# Altium footprint library NtentePoC.PcbLib: 32 footprints (part 2 of 2)
Each footprint in its own frame and in the unit in brackets; x right, y up, seen from the top. Pads: shape width x height; smd on the part's side, far side on the other; paste and mask are expansions set on the pad; w line width, h text height; cw(c..) or ccw(c..) is an arc to the next point about the centre after c.
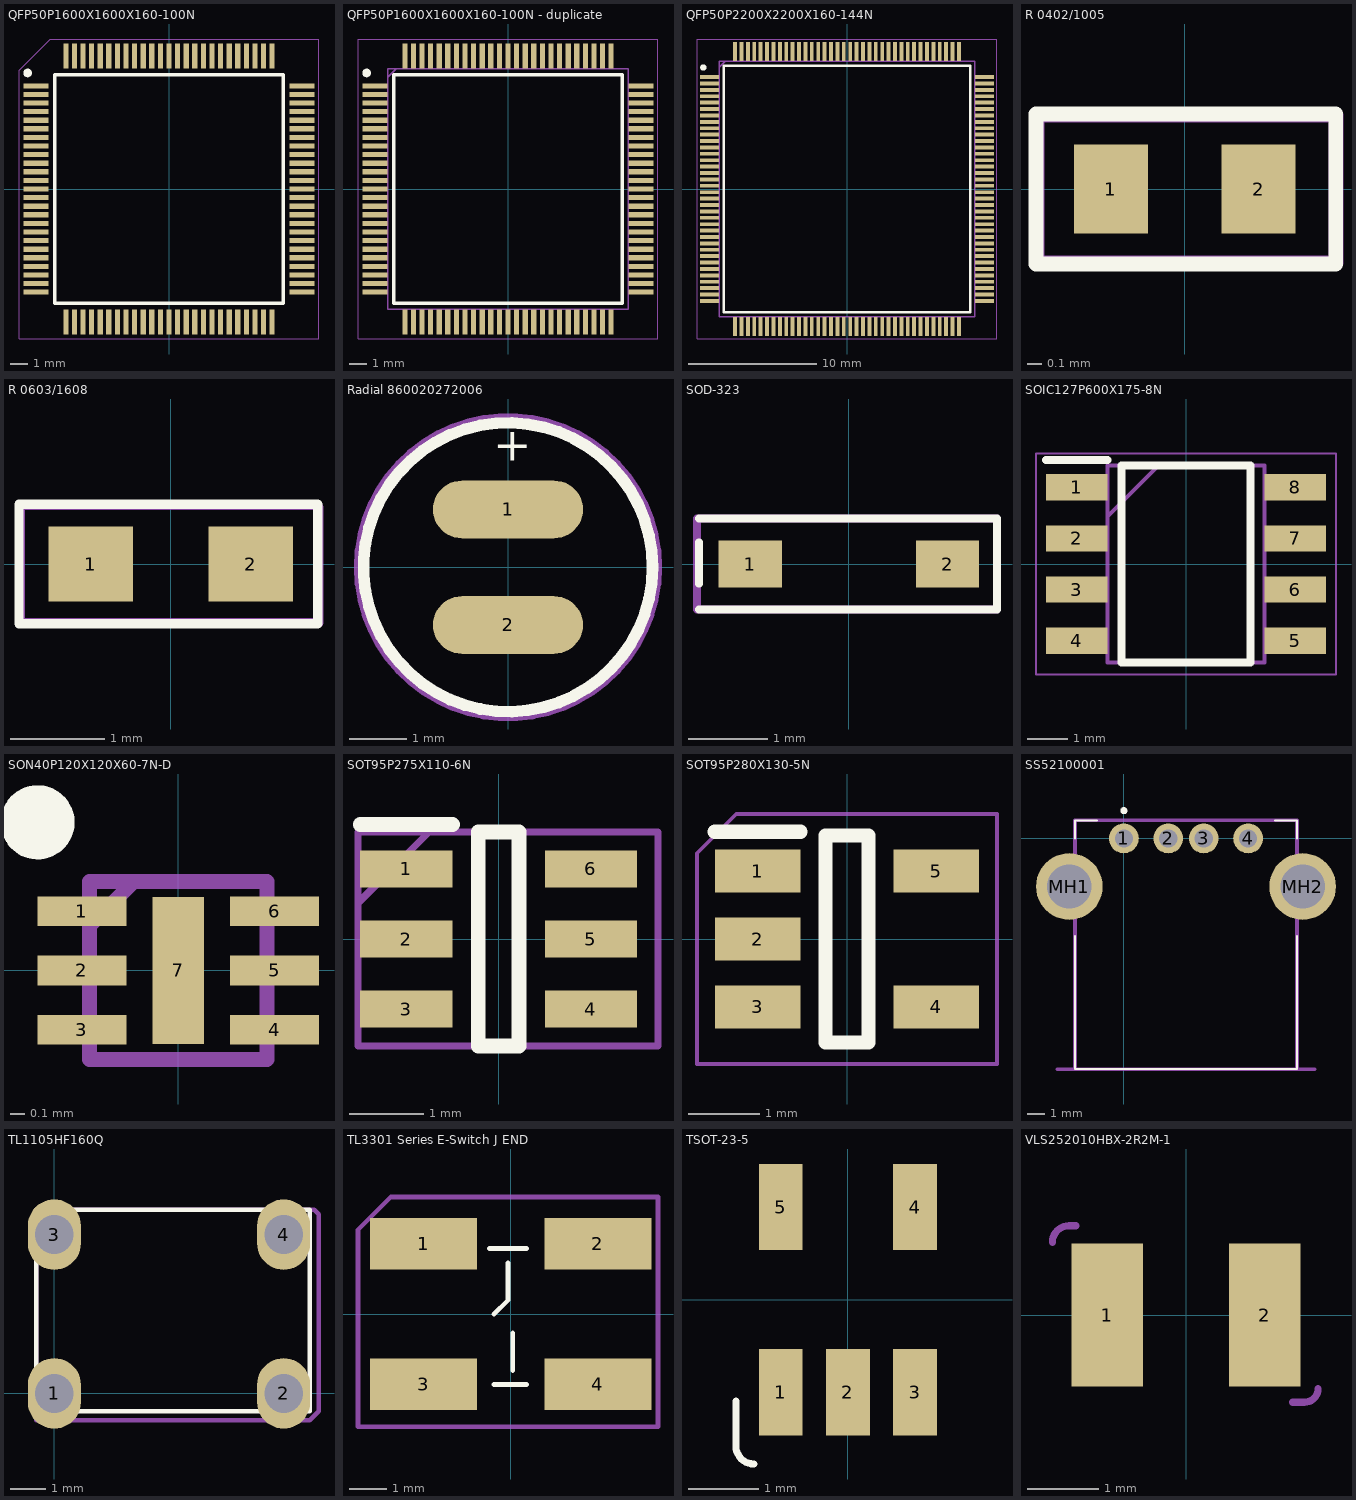
[diagram p1: the footprints below, top view; thin cyan lines are the x and y axes]

## QFP50P1600X1600X160-100N [mm]
pads (100):
  rect 1.475x0.3 smd: 1(-7.738,6) 2(-7.738,5.5) 3(-7.738,5) 4(-7.738,4.5) 5(-7.738,4) 6(-7.738,3.5) 7(-7.738,3) 8(-7.738,2.5) 9(-7.738,2) 10(-7.738,1.5) 11(-7.738,1) 12(-7.738,0.5) 13(-7.738,0) 14(-7.738,-0.5) 15(-7.738,-1) 16(-7.738,-1.5) 17(-7.738,-2) 18(-7.738,-2.5) 19(-7.738,-3) 20(-7.738,-3.5) 21(-7.738,-4) 22(-7.738,-4.5) 23(-7.738,-5) 24(-7.738,-5.5) 25(-7.738,-6) 51(7.738,-6) 52(7.738,-5.5) 53(7.738,-5) 54(7.738,-4.5) 55(7.738,-4) 56(7.738,-3.5) 57(7.738,-3) 58(7.738,-2.5) 59(7.738,-2) 60(7.738,-1.5) 61(7.738,-1) 62(7.738,-0.5) 63(7.738,0) 64(7.738,0.5) 65(7.738,1) 66(7.738,1.5) 67(7.738,2) 68(7.738,2.5) 69(7.738,3) 70(7.738,3.5) 71(7.738,4) 72(7.738,4.5) 73(7.738,5) 74(7.738,5.5) 75(7.738,6)
  rect 0.3x1.475 smd: 26(-6,-7.738) 27(-5.5,-7.738) 28(-5,-7.738) 29(-4.5,-7.738) 30(-4,-7.738) 31(-3.5,-7.738) 32(-3,-7.738) 33(-2.5,-7.738) 34(-2,-7.738) 35(-1.5,-7.738) 36(-1,-7.738) 37(-0.5,-7.738) 38(0,-7.738) 39(0.5,-7.738) 40(1,-7.738) 41(1.5,-7.738) 42(2,-7.738) 43(2.5,-7.738) 44(3,-7.738) 45(3.5,-7.738) 46(4,-7.738) 47(4.5,-7.738) 48(5,-7.738) 49(5.5,-7.738) 50(6,-7.738) 76(6,7.738) 77(5.5,7.738) 78(5,7.738) 79(4.5,7.738) 80(4,7.738) 81(3.5,7.738) 82(3,7.738) 83(2.5,7.738) 84(2,7.738) 85(1.5,7.738) 86(1,7.738) 87(0.5,7.738) 88(0,7.738) 89(-0.5,7.738) 90(-1,7.738) 91(-1.5,7.738) 92(-2,7.738) 93(-2.5,7.738) 94(-3,7.738) 95(-3.5,7.738) 96(-4,7.738) 97(-4.5,7.738) 98(-5,7.738) 99(-5.5,7.738) 100(-6,7.738)
Top Overlay:
  circle w0.25: c-8.225,6.75 r0.125
  lines w0.2: -6.65,-6.65 6.65,-6.65 6.65,6.65 -6.65,6.65 -6.65,-6.65
Mechanical 29 (Mech29):
  lines w0.05: -8.725,-8.725 -8.725,6.896 -6.896,8.725 8.725,8.725 8.725,-8.725 -8.725,-8.725
  text ".Designator" at -2.413,-0.381 h1
3D body "STM32F407VET6.stp": height 1.6, standoff 0, extent -8,-8 8,8

## QFP50P1600X1600X160-100N - duplicate [mm]
pads (100):
  rect 1.475x0.3 smd: 1(-7.738,6) 2(-7.738,5.5) 3(-7.738,5) 4(-7.738,4.5) 5(-7.738,4) 6(-7.738,3.5) 7(-7.738,3) 8(-7.738,2.5) 9(-7.738,2) 10(-7.738,1.5) 11(-7.738,1) 12(-7.738,0.5) 13(-7.738,0) 14(-7.738,-0.5) 15(-7.738,-1) 16(-7.738,-1.5) 17(-7.738,-2) 18(-7.738,-2.5) 19(-7.738,-3) 20(-7.738,-3.5) 21(-7.738,-4) 22(-7.738,-4.5) 23(-7.738,-5) 24(-7.738,-5.5) 25(-7.738,-6) 51(7.738,-6) 52(7.738,-5.5) 53(7.738,-5) 54(7.738,-4.5) 55(7.738,-4) 56(7.738,-3.5) 57(7.738,-3) 58(7.738,-2.5) 59(7.738,-2) 60(7.738,-1.5) 61(7.738,-1) 62(7.738,-0.5) 63(7.738,0) 64(7.738,0.5) 65(7.738,1) 66(7.738,1.5) 67(7.738,2) 68(7.738,2.5) 69(7.738,3) 70(7.738,3.5) 71(7.738,4) 72(7.738,4.5) 73(7.738,5) 74(7.738,5.5) 75(7.738,6)
  rect 0.3x1.475 smd: 26(-6,-7.738) 27(-5.5,-7.738) 28(-5,-7.738) 29(-4.5,-7.738) 30(-4,-7.738) 31(-3.5,-7.738) 32(-3,-7.738) 33(-2.5,-7.738) 34(-2,-7.738) 35(-1.5,-7.738) 36(-1,-7.738) 37(-0.5,-7.738) 38(0,-7.738) 39(0.5,-7.738) 40(1,-7.738) 41(1.5,-7.738) 42(2,-7.738) 43(2.5,-7.738) 44(3,-7.738) 45(3.5,-7.738) 46(4,-7.738) 47(4.5,-7.738) 48(5,-7.738) 49(5.5,-7.738) 50(6,-7.738) 76(6,7.738) 77(5.5,7.738) 78(5,7.738) 79(4.5,7.738) 80(4,7.738) 81(3.5,7.738) 82(3,7.738) 83(2.5,7.738) 84(2,7.738) 85(1.5,7.738) 86(1,7.738) 87(0.5,7.738) 88(0,7.738) 89(-0.5,7.738) 90(-1,7.738) 91(-1.5,7.738) 92(-2,7.738) 93(-2.5,7.738) 94(-3,7.738) 95(-3.5,7.738) 96(-4,7.738) 97(-4.5,7.738) 98(-5,7.738) 99(-5.5,7.738) 100(-6,7.738)
Top Overlay:
  circle w0.25: c-8.225,6.75 r0.125
  lines w0.2: -6.65,-6.65 -6.65,6.65 6.65,6.65 6.65,-6.65 -6.65,-6.65
Mechanical 13:
  lines w0.1: -7,6.5 -6.5,7 ; -7,-7 -7,7 7,7 7,-7 -7,-7
Mechanical 15:
  lines w0.05: -8.725,-8.725 -8.725,8.725 8.725,8.725 8.725,-8.725 -8.725,-8.725
3D body "STM32F107VCT6.stp": height 1.6, standoff 0, extent -8,-8 8,8

## QFP50P2200X2200X160-144N [mm]
pads (144):
  rect 1.475x0.3 smd: 1(-10.738,8.75) 2(-10.738,8.25) 3(-10.738,7.75) 4(-10.738,7.25) 5(-10.738,6.75) 6(-10.738,6.25) 7(-10.738,5.75) 8(-10.738,5.25) 9(-10.738,4.75) 10(-10.738,4.25) 11(-10.738,3.75) 12(-10.738,3.25) 13(-10.738,2.75) 14(-10.738,2.25) 15(-10.738,1.75) 16(-10.738,1.25) 17(-10.738,0.75) 18(-10.738,0.25) 19(-10.738,-0.25) 20(-10.738,-0.75) 21(-10.738,-1.25) 22(-10.738,-1.75) 23(-10.738,-2.25) 24(-10.738,-2.75) 25(-10.738,-3.25) 26(-10.738,-3.75) 27(-10.738,-4.25) 28(-10.738,-4.75) 29(-10.738,-5.25) 30(-10.738,-5.75) 31(-10.738,-6.25) 32(-10.738,-6.75) 33(-10.738,-7.25) 34(-10.738,-7.75) 35(-10.738,-8.25) 36(-10.738,-8.75) 73(10.738,-8.75) 74(10.738,-8.25) 75(10.738,-7.75) 76(10.738,-7.25) 77(10.738,-6.75) 78(10.738,-6.25) 79(10.738,-5.75) 80(10.738,-5.25) 81(10.738,-4.75) 82(10.738,-4.25) 83(10.738,-3.75) 84(10.738,-3.25) 85(10.738,-2.75) 86(10.738,-2.25) 87(10.738,-1.75) 88(10.738,-1.25) 89(10.738,-0.75) 90(10.738,-0.25) 91(10.738,0.25) 92(10.738,0.75) 93(10.738,1.25) 94(10.738,1.75) 95(10.738,2.25) 96(10.738,2.75) 97(10.738,3.25) 98(10.738,3.75) 99(10.738,4.25) 100(10.738,4.75) 101(10.738,5.25) 102(10.738,5.75) 103(10.738,6.25) 104(10.738,6.75) 105(10.738,7.25) 106(10.738,7.75) 107(10.738,8.25) 108(10.738,8.75)
  rect 0.3x1.475 smd: 37(-8.75,-10.738) 38(-8.25,-10.738) 39(-7.75,-10.738) 40(-7.25,-10.738) 41(-6.75,-10.738) 42(-6.25,-10.738) 43(-5.75,-10.738) 44(-5.25,-10.738) 45(-4.75,-10.738) 46(-4.25,-10.738) 47(-3.75,-10.738) 48(-3.25,-10.738) 49(-2.75,-10.738) 50(-2.25,-10.738) 51(-1.75,-10.738) 52(-1.25,-10.738) 53(-0.75,-10.738) 54(-0.25,-10.738) 55(0.25,-10.738) 56(0.75,-10.738) 57(1.25,-10.738) 58(1.75,-10.738) 59(2.25,-10.738) 60(2.75,-10.738) 61(3.25,-10.738) 62(3.75,-10.738) 63(4.25,-10.738) 64(4.75,-10.738) 65(5.25,-10.738) 66(5.75,-10.738) 67(6.25,-10.738) 68(6.75,-10.738) 69(7.25,-10.738) 70(7.75,-10.738) 71(8.25,-10.738) 72(8.75,-10.738) 109(8.75,10.738) 110(8.25,10.738) 111(7.75,10.738) 112(7.25,10.738) 113(6.75,10.738) 114(6.25,10.738) 115(5.75,10.738) 116(5.25,10.738) 117(4.75,10.738) 118(4.25,10.738) 119(3.75,10.738) 120(3.25,10.738) 121(2.75,10.738) 122(2.25,10.738) 123(1.75,10.738) 124(1.25,10.738) 125(0.75,10.738) 126(0.25,10.738) 127(-0.25,10.738) 128(-0.75,10.738) 129(-1.25,10.738) 130(-1.75,10.738) 131(-2.25,10.738) 132(-2.75,10.738) 133(-3.25,10.738) 134(-3.75,10.738) 135(-4.25,10.738) 136(-4.75,10.738) 137(-5.25,10.738) 138(-5.75,10.738) 139(-6.25,10.738) 140(-6.75,10.738) 141(-7.25,10.738) 142(-7.75,10.738) 143(-8.25,10.738) 144(-8.75,10.738)
Top Overlay:
  circle w0.25: c-11.225,9.5 r0.125
  lines w0.2: -9.65,-9.65 9.65,-9.65 9.65,9.65 -9.65,9.65 -9.65,-9.65
Mechanical 13:
  lines w0.1: -10,9.5 -9.5,10 ; -10,-10 10,-10 10,10 -10,10 -10,-10
  text ".Designator" at -2.032,-1.27 h1
Mechanical 15:
  lines w0.05: -11.725,-11.725 11.725,-11.725 11.725,11.725 -11.725,11.725 -11.725,-11.725
3D body "STM32F407ZET6.stp": height 1.6, standoff 0, extent -11,-11 11,11

## R 0402/1005 [mm]
pads (2):
  rect 0.5x0.6 smd: 1(-0.5,0) 2(0.5,0)
Top Overlay:
  lines w0.1: -1.008,-0.508 -1.008,0.508 1.024,0.508 1.024,-0.508 -1.008,-0.508
Mechanical 29 (Mech29):
  lines w0.1: -1,-0.5 1.025,-0.5 1.025,0.5 -1,0.5 -1,-0.5
  text ".Designator" at -0.85,-0.3 h0.6
3D body: height 0.64, standoff 0, extent 0.525,-0.3 0.75,0.3
3D body: height 0.64, standoff 0, extent -0.75,-0.3 -0.5,0.3
3D body: height 0.64, standoff 0, extent -0.5,-0.3 0.525,0.3

## R 0603/1608 [mm]
pads (2):
  rect 0.9x0.8 smd: 1(-0.85,0) 2(0.85,0)
Top Overlay:
  lines w0.1: -1.612,-0.635 -1.612,0.635 1.563,0.635 1.563,-0.635 -1.612,-0.635
Mechanical 29 (Mech29):
  lines w0.1: -1.6,-0.625 -1.6,0.625 1.55,0.625 1.575,0.6 1.575,-0.625 -1.6,-0.625
  text ".Designator" at -1.425,-0.4 h0.8
3D body: height 0.64, standoff 0, extent -0.85,-0.4 0.85,0.4
3D body: height 0.64, standoff 0, extent -1.3,-0.4 -0.85,0.4
3D body: height 0.64, standoff 0, extent 0.85,-0.4 1.3,0.4

## Radial 860020272006 [mm]
pads (2):
  oval 2.6x1 smd: 1(0,1) 2(0,-1)
Top Overlay:
  circle w0.2: c0,0 r2.5
  text "+" at -0.254,1.651 h1
Mechanical 29 (Mech29):
  circle w0.254: c0,0 r2.54
  text ".Designator" at -1.079,-0.254 h1
3D body: height 5.05, standoff 0.05, extent 2.032,-2.5 13.032,2.5

## SOD-323 [mm]
pads (2):
  rect 0.8x0.6 smd: 1(-1.25,0) 2(1.25,0)
Top Overlay:
  lines w0.1: -1.9,-0.575 1.875,-0.575 1.875,0.575 -1.9,0.575 ; -1.9,-0.25 -1.9,0.275
Mechanical 29 (Mech29):
  lines w0.1: 1.875,0.575 -1.925,0.575 -1.925,-0.575 0.75,-0.575 1.875,-0.575 1.875,0.575 ; 1.875,0.575 1.875,0.575
  text ".Designator" at -1.6,-0.4 h1
3D body "SOD323.step": height 0.9, standoff -0.09, extent -1.225,-0.625 1.275,0.625

## SOIC127P600X175-8N [mm]
pads (8):
  rect 1.525x0.65 smd: 1(-2.712,1.905) 2(-2.712,0.635) 3(-2.712,-0.635) 4(-2.712,-1.905) 5(2.712,-1.905) 6(2.712,-0.635) 7(2.712,0.635) 8(2.712,1.905)
Top Overlay:
  lines w0.2: -3.475,2.58 -1.95,2.58 ; -1.6,-2.45 -1.6,2.45 1.6,2.45 1.6,-2.45 -1.6,-2.45
Mechanical 13:
  lines w0.1: -1.95,1.18 -0.68,2.45 ; -1.95,-2.45 -1.95,2.45 1.95,2.45 1.95,-2.45 -1.95,-2.45
Mechanical 15:
  lines w0.05: -3.725,-2.75 -3.725,2.75 3.725,2.75 3.725,-2.75 -3.725,-2.75
3D body "NE555DR.stp": height 1.75, standoff 0, extent -3,-2.45 3,2.45

## SON40P120X120X60-7N-D [mm]
pads (7):
  rect 0.6x0.2 smd: 1(-0.65,0.4) 2(-0.65,0) 3(-0.65,-0.4) 4(0.65,-0.4) 5(0.65,0) 6(0.65,0.4)
  rect 0.35x0.99 smd: 7(0,0)
Top Overlay:
  circle w0.25: c-0.95,1 r0.125
Mechanical 29 (Mech29):
  lines w0.1: -0.6,0.3 -0.3,0.6 ; -0.6,-0.6 0.6,-0.6 0.6,0.6 -0.6,0.6 -0.6,-0.6
3D body "MIC5528-3.3YMT-TR.stp": height 0.6, standoff 0, extent -0.65,-0.6 0.65,0.6

## SOT95P275X110-6N [mm]
pads (6):
  rect 1.25x0.5 smd: 1(-1.25,0.95) 2(-1.25,0) 3(-1.25,-0.95) 4(1.25,-0.95) 5(1.25,0) 6(1.25,0.95)
Top Overlay:
  lines w0.2: -1.875,1.55 -0.625,1.55 ; -0.275,-1.45 0.275,-1.45 0.275,1.45 -0.275,1.45 -0.275,-1.45
Mechanical 29 (Mech29):
  lines w0.1: -1.893,0.5 -0.943,1.45 ; -1.905,-1.45 -1.905,1.45 2.159,1.45 2.159,-1.45 -1.905,-1.45
  text ".Designator" at -1.905,-0.508 h1
3D body "IP4234CZ6,125.stp": height 1.1, standoff 0, extent -1.375,-1.45 1.375,1.45

## SOT95P280X130-5N [mm]
pads (5):
  rect 1.2x0.6 smd: 1(-1.25,0.95) 2(-1.25,0) 3(-1.25,-0.95) 4(1.25,-0.95) 5(1.25,0.95)
Top Overlay:
  lines w0.2: -1.85,1.5 -0.65,1.5 ; -0.3,-1.45 0.3,-1.45 0.3,1.45 -0.3,1.45 -0.3,-1.45
Mechanical 1:
  text ".Designator" at -1.905,-0.381 h1
Mechanical 29 (Mech29):
  lines w0.05: -2.1,-1.75 -2.1,1.202 -1.552,1.75 2.1,1.75 2.1,-1.75 -2.1,-1.75
3D body "MIC2005A-1YM5-TR.stp": height 1.3, standoff 0, extent -1.4,-1.45 1.4,1.45

## SS52100001 [mm]
pads (6):
  round 1.68 hole 1.02: 1(0,0) 2(2.5,0) 3(4.5,0) 4(7,0)
  round 3.75 hole 2.5: MH1(-3.07,-2.71) MH2(10.07,-2.71)
Top Overlay:
  lines w0.1: -2.75,-5.49 -2.75,-12.99 9.75,-12.99 9.75,-5.49 ; -2.75,0 -2.75,1.01 -1.5,1.01 ; 8.5,1.01 9.75,1.01 9.75,0
  lines w0.2: -0.1,1.56 ccw(c0,1.56) 0.1,1.56 ccw(c0,1.56) -0.1,1.56
Mechanical 29 (Mech29):
  lines w0.2: -3.75,-12.99 10.75,-12.99 -3.75,-12.99 ; -2.75,-12.99 9.75,-12.99 9.75,1.01 -2.75,1.01 -2.75,-12.99
  text ".Designator" at 0,-7.239 h1
3D body "72w2538_292303-4.stp": height 7.62, standoff -3.65, extent -4.657,-13.04 11.577,0.96

## TL1105HF160Q [mm]
pads (4):
  oval 1.5x2 hole 1.1: 1(0,0) 2(6.5,0) 3(0,4.5) 4(6.5,4.5)
Top Overlay:
  lines w0.127: -0.508,-0.508 7.239,-0.508 7.239,5.207 -0.508,5.207 -0.508,-0.508
Mechanical 29 (Mech29):
  lines w0.127: -0.508,-0.762 -0.508,5.207 7.366,5.207 7.493,5.08 7.493,-0.508 7.239,-0.762 -0.508,-0.762
  text ".Designator" at 1.524,1.778 h1
3D body "TL1105HFxxxx.stp": height 12.51, standoff -3.54, extent -0.518,-0.714 7.376,5.286

## TL3301 Series E-Switch J END [mm]
pads (4):
  rect 2.9x1.4 smd: 1(-2.36,1.9) 2(2.36,1.9) 3(-2.36,-1.9) 4(2.36,-1.9)
Top Overlay:
  lines w0.127: -0.582,1.773 0.434,1.773 ; -0.455,-1.91 0.434,-1.91 ; -0.455,-0.005 -0.074,0.376 -0.074,1.392 ; 0.053,-1.529 0.053,-0.513
Mechanical 29 (Mech29):
  lines w0.127: -4.138,-3.053 -4.138,2.281 -3.249,3.17 3.99,3.17 3.99,-3.053 -4.138,-3.053
  text ".Designator" at -1.979,-0.386 h1
3D body "TL3301CFxxxxJ.stp": height 8.42, standoff 0.12, extent -3.375,-3.132 3.227,2.868

## TSOT-23-5 [mm]
pads (5):
  rect 0.62x1.22 smd: 1(-0.95,-1.31) 2(0,-1.31) 3(0.95,-1.31) 4(0.95,1.31) 5(-0.95,1.31)
Top Overlay:
  lines w0.1: -1.585,-1.437 -1.585,-2.072 ccw(c-1.331,-2.072) -1.331,-2.326
Mechanical 29 (Mech29):
  text ".Designator" at -1.331,-0.294 h1
3D body "User Library-tsot-23-5.step": height 0.85, standoff -0.13, extent -1.45,-1.31 1.45,1.489

## VLS252010HBX-2R2M-1 [mm]
pads (2):
  rect 1x2 smd: 1(-1.1,0) 2(1.1,0)
Mechanical 29 (Mech29):
  lines w0.1: -1.87,1.02 cw(c-1.64,1.02) -1.64,1.25 -1.54,1.25 ; 1.49,-1.22 1.66,-1.22 ccw(c1.66,-1.03) 1.85,-1.03
  text ".Designator" at -1.09,-0.5 h1
3D body "vls252010hbx-1.step": height 0.99, standoff -0.01, extent -1.26,-1.01 1.24,0.99